# Altium footprint library SoM_Artix.PcbLib: 239 footprints (part 1 of 15)
Each footprint in its own frame and in the unit in brackets; x right, y up, seen from the top. Pads: shape width x height; smd on the part's side, far side on the other; paste and mask are expansions set on the pad; w line width, h text height; cw(c..) or ccw(c..) is an arc to the next point about the centre after c.
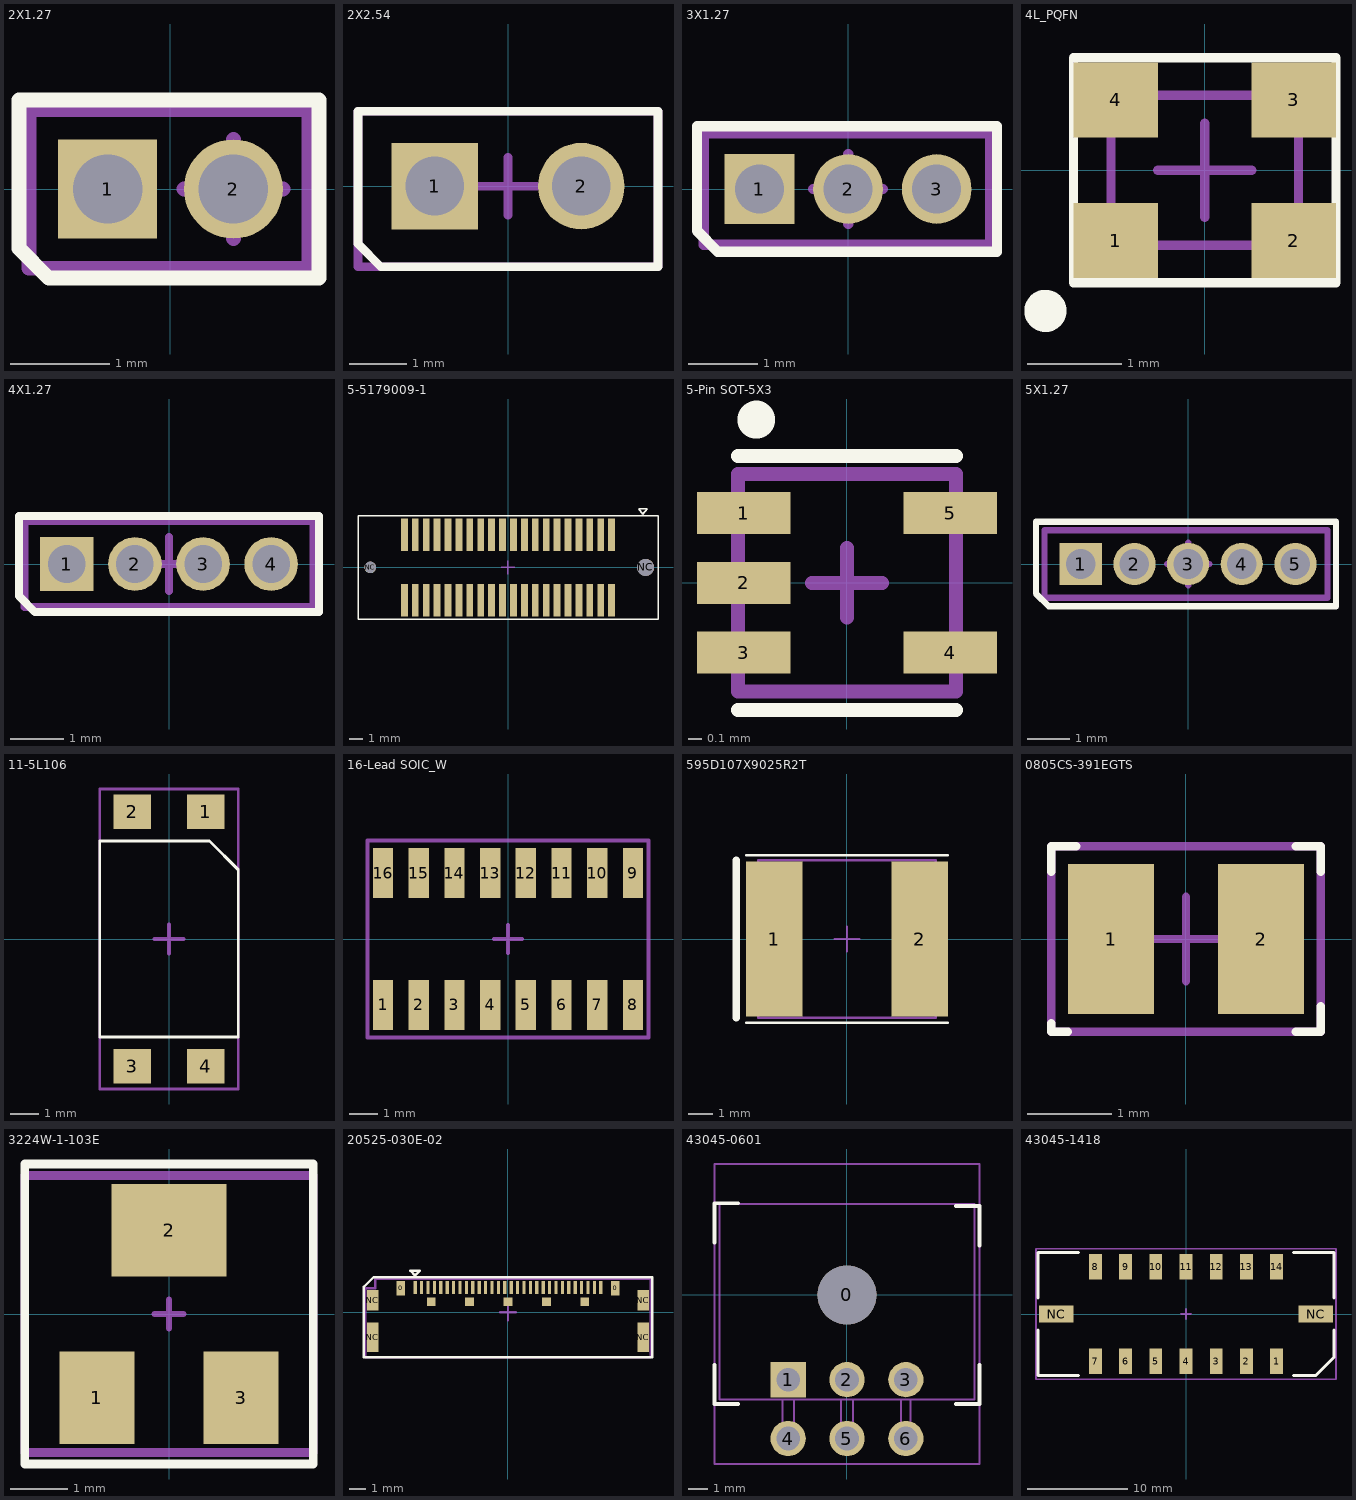
[diagram p0: the footprints below, top view; thin cyan lines are the x and y axes]

## 2X1.27 [mm]
pads (2):
  rect 1x1 hole 0.7: 1(-0.635,0)
  round 1 hole 0.7: 2(0.635,0)
Top Overlay:
  lines w0.15: -1.53,-0.6 -1.23,-0.9 1.5,-0.9 1.5,0.9 -1.53,0.9 -1.53,-0.6
Mechanical 15:
  lines w0.15: 0.135,0 1.135,0 ; 0.635,-0.5 0.635,0.5 ; -1.43,-0.8 1.4,-0.8 1.4,0.8 -1.43,0.8 -1.43,-0.8

## 2X2.54 [mm]
pads (2):
  rect 1.5x1.5 hole 1.02: 1(-1.27,0)
  round 1.5 hole 1.02: 2(1.27,0)
Top Overlay:
  lines w0.15: -2.6,-1 -2.6,1.3 2.6,1.3 2.6,-1.4 -2.2,-1.4 -2.6,-1
Mechanical 15:
  lines w0.15: -0.5,0 0.5,0 ; 0,-0.5 0,0.5 ; -2.6,-1.4 -2.6,1.3 2.6,1.3 2.6,-1.4 -2.6,-1.4
3D body "User Library-PLS-2.step": height 8.54, standoff -3, extent -2.54,-1.3 2.54,1.24

## 3X1.27 [mm]
pads (3):
  rect 1x1 hole 0.7: 1(-1.27,0)
  round 1 hole 0.7: 2(0,0) 3(1.27,0)
Top Overlay:
  lines w0.15: -2.165,-0.6 -2.165,0.9 2.135,0.9 2.135,-0.9 -1.865,-0.9 -2.165,-0.6
Mechanical 15:
  lines w0.15: -0.5,0 0.5,0 ; 0,-0.5 0,0.5 ; -2.065,-0.8 -2.065,0.8 2.035,0.8 2.035,-0.8 -2.065,-0.8

## 4L_PQFN [mm] "2.0X2.5X0.75 mm"
height 0.75
pads (4):
  rect 0.9x0.8 smd: 1(-0.95,-0.75) 2(0.95,-0.75) 3(0.95,0.75) 4(-0.95,0.75)
Top Overlay:
  circle w0.25: c-1.7,-1.5 r0.1
  lines w0.1: -1.4,-1.2 1.4,-1.2 1.4,1.2 -1.4,1.2 -1.4,-1.2
Mechanical 15:
  lines w0.1: -0.5,0 0.5,0 ; 0,-0.5 0,0.5 ; -1,-0.8 -1,0.8 1,0.8 1,-0.8 -1,-0.8 ; 0,0 0,0

## 4X1.27 [mm]
pads (4):
  rect 1x1 hole 0.7: 1(-1.905,0)
  round 1 hole 0.7: 2(-0.635,0) 3(0.635,0) 4(1.905,0)
Top Overlay:
  lines w0.15: -2.8,-0.6 -2.5,-0.9 2.8,-0.9 2.8,0.9 -2.8,0.9 -2.8,-0.6
Mechanical 15:
  lines w0.15: -0.5,0 0.5,0 ; 0,-0.5 0,0.5 ; -2.7,-0.8 2.7,-0.8 2.7,0.8 -2.7,0.8 -2.7,-0.8

## 5-5179009-1 [mm]
height 12
pads (42):
  rect 0.5x2.4 smd mask+0.05: 1(7.6,2.4) 2(7.6,-2.4) 3(6.8,2.4) 4(6.8,-2.4) 5(6,2.4) 6(6,-2.4) 7(5.2,2.4) 8(5.2,-2.4) 9(4.4,2.4) 10(4.4,-2.4) 11(3.6,2.4) 12(3.6,-2.4) 13(2.8,2.4) 14(2.8,-2.4) 15(2,2.4) 16(2,-2.4) 17(1.2,2.4) 18(1.2,-2.4) 19(0.4,2.4) 20(0.4,-2.4) 21(-0.4,2.4) 22(-0.4,-2.4) 23(-1.2,2.4) 24(-1.2,-2.4) 25(-2,2.4) 26(-2,-2.4) 27(-2.8,2.4) 28(-2.8,-2.4) 29(-3.6,2.4) 30(-3.6,-2.4) 31(-4.4,2.4) 32(-4.4,-2.4) 33(-5.2,2.4) 34(-5.2,-2.4) 35(-6,2.4) 36(-6,-2.4) 37(-6.8,2.4) 38(-6.8,-2.4) 39(-7.6,2.4) 40(-7.6,-2.4)
  round 0.85 hole 0.85 unplated mask+0.05: NC(-10.1,0)
  round 1.25 hole 1.25 unplated mask+0.05: NC(10.1,0)
Top Overlay:
  lines w0.1: -11,-3.8 11,-3.8 11,3.8 -11,3.8 -11,-3.8 ; 9.6,4.3 9.9,3.9 10.2,4.3 9.6,4.3
Mechanical 15:
  lines w0.1: -0.5,0 0.5,0 ; 0,-0.502 0,0.498
3D body "User Library-c-5-5179009-1-a-3d.step": height 7.7, standoff -0.55, extent -10.9,-3.4 10.9,3.4

## 5-Pin SOT-5X3 [mm]
pads (5):
  rect 0.67x0.3 smd: 1(-0.74,0.5) 2(-0.74,0) 3(-0.74,-0.5) 4(0.74,-0.5) 5(0.74,0.5)
Top Overlay:
  circle w0.25: c-0.65,1.17 r0.01
  lines w0.1: -0.78,-0.91 0.78,-0.91 ; -0.78,0.91 0.78,0.91
Mechanical 15:
  lines w0.1: -0.25,0 0.25,0 ; 0,-0.25 0,0.25 ; -0.78,-0.78 0.78,-0.78 0.78,0.78 -0.78,0.78 -0.78,-0.78
3D body "SN74LVC1G14DRLRG4.STEP": height 0.59, standoff -0.01, extent -0.8,-0.8 0.8,0.8

## 5X1.27 [mm]
pads (5):
  rect 1x1 hole 0.7: 1(-2.54,0)
  round 1 hole 0.7: 2(-1.27,0) 3(0,0) 4(1.27,0) 5(2.54,0)
Top Overlay:
  lines w0.15: -3.6,-0.7 -3.6,1 3.5,1 3.5,-1 -3.3,-1 -3.6,-0.7
Mechanical 15:
  lines w0.15: -0.5,0 0.5,0 ; 0,-0.5 0,0.5 ; -3.4,-0.8 3.3,-0.8 3.3,0.8 0,0.8 -3.4,0.8 -3.4,-0.8

## 11-5L106 [mm]
pads (4):
  rect 1.3x1.2 smd mask+0.05: 1(1.27,4.41) 2(-1.27,4.41) 3(-1.27,-4.41) 4(1.27,-4.41)
Top Overlay:
  lines w0.1: -2.4,-3.4 -2.4,3.4 1.4,3.4 2.4,2.4 2.4,-3.4 -2.4,-3.4
Mechanical 15:
  lines w0.1: -2.4,-5.2 -2.4,5.2 2.4,5.2 2.4,-5.2 -2.4,-5.2
  lines w0.15: -0.5,0 0.5,0 ; 0,-0.5 0,0.5
3D body "CircuitWorks-OPTOCOUPLER TLP521-2.step": height 3.72, standoff -0.03, extent -2.29,-4.288 2.29,4.288

## 16-Lead SOIC_W [mm]
pads (16):
  rect 0.72x1.78 smd: 1(-4.445,-2.34) 2(-3.175,-2.34) 3(-1.905,-2.34) 4(-0.635,-2.34) 5(0.635,-2.34) 6(1.905,-2.34) 7(3.175,-2.34) 8(4.445,-2.34) 9(4.445,2.34) 10(3.175,2.34) 11(1.905,2.34) 12(0.635,2.34) 13(-0.635,2.34) 14(-1.905,2.34) 15(-3.175,2.34) 16(-4.445,2.34)
Mechanical 15:
  lines w0.15: -0.5,0 0.5,0 ; 0,-0.5 0,0.5 ; -5,-3.5 -5,3.5 5,3.5 5,-3.5 -5,-3.5

## 595D107X9025R2T [mm]
pads (2):
  rect 2.3x6.3 smd: 1(-2.95,0) 2(2.95,0)
Top Overlay:
  lines w0.1: -4.1,-3.4 4.1,-3.4 ; -4.1,3.4 4.1,3.4
  lines w0.3: -4.5,-3.2 -4.5,3.2
Mechanical 13:
  lines w0.1: -0.5,0 0.5,0 ; 0,-0.5 0,0.5 ; -3.6,-3.2 3.6,-3.2 3.6,3.2 -3.6,3.2 -3.6,-3.2
3D body "User Library-595D-R_SW.step": height 3.5, standoff 0, extent -3.9,-3 3.3,3

## 0805CS-391EGTS [mm]
pads (2):
  rect 1.02x1.78 smd mask+0.05: 1(-0.89,0) 2(0.89,0)
Top Overlay:
  lines w0.1: -1.6,-1 -1.6,-1.1 -1.4,-1.1 ; -1.6,0.8 -1.6,1.1 -1.3,1.1 ; 1.3,-1.1 1.6,-1.1 1.6,-0.8 ; 1.3,1.1 1.6,1.1 1.6,0.8
Mechanical 15:
  lines w0.1: -0.5,0 0.5,0 ; 0,-0.5 0,0.5 ; -1.6,-1.1 1.6,-1.1 1.6,1.1 -1.6,1.1 -1.6,-1.1
3D body "Coilcraft-0805CS.step": height 1.51, standoff -0.01, extent -1.145,-0.863 1.145,0.863

## 3224W-1-103E [mm]
height 5.1
pads (3):
  rect 1.3x1.6 smd: 1(-1.25,-1.45) 3(1.25,-1.45)
  rect 2x1.6 smd: 2(0,1.45)
Top Overlay:
  lines w0.15: -2.5,-2.6 -2.5,2.6 2.5,2.6 2.5,-2.6 -2.5,-2.6
Mechanical 13:
  lines w0.1: -0.25,0 0.25,0 ; 0,-0.25 0,0.25
  lines w0.15: -2.5,-2.4 2.5,-2.4 2.5,2.4 -2.5,2.4 -2.5,-2.4
3D body "User Library-3224w-1-501e.step": height 5.29, standoff 0, extent -2.413,-2.038 2.413,1.9

## 20525-030E-02 [mm] "I-PEX"
height 1
pads (41):
  rect 0.55x0.9 smd mask+0.05: 0(-6.7,1.513) 0(6.7,1.513)
  rect 0.2x0.8 smd mask+0.05: 1(-5.8,1.563) 2(-5.4,1.563) 3(-5,1.563) 4(-4.6,1.563) 5(-4.2,1.563) 6(-3.8,1.563) 7(-3.4,1.563) 8(-3,1.563) 9(-2.6,1.563) 10(-2.2,1.563) 11(-1.8,1.563) 12(-1.4,1.563) 13(-1,1.563) 14(-0.6,1.563) 15(-0.2,1.563) 16(0.2,1.563) 17(0.6,1.563) 18(1,1.563) 19(1.4,1.563) 20(1.8,1.563) 21(2.2,1.563) 22(2.6,1.563) 23(3,1.563) 24(3.4,1.563) 25(3.8,1.563) 26(4.2,1.563) 27(4.6,1.563) 28(5,1.563) 29(5.4,1.563) 30(5.8,1.563)
  rect 0.71x1.85 smd mask+0.05: NC(-8.445,-1.562) NC(8.445,-1.562)
  rect 0.71x1.3 smd mask+0.05: NC(-8.445,0.763) NC(8.445,0.763)
  rect 0.55x0.55 smd mask+0.05: NC(-4.8,0.66) NC(-2.4,0.66) NC(0,0.66) NC(2.4,0.66) NC(4.8,0.66)
Top Overlay:
  lines w0.15: -9,-2.8 -9,1.6 -8.4,2.2 9,2.2 9,-2.8 -9,-2.8 ; -6.1,2.6 -5.5,2.6 -5.8,2.3 -6.1,2.6
Mechanical 13:
  lines w0.15: -0.5,0 0.5,0 ; 0,-0.5 0,0.5 ; -8.9,-2.8 -8.9,1.5 -8.3,1.5 -8.3,2.1 8.9,2.1 8.9,-2.8 -8.9,-2.8
3D body "20525-x30E-02C_RECE_ASS'Y_STEP_R7_ALL.STEP": height 1, standoff 0, extent -8.6,-2.588 8.6,1.562

## 43045-0601 [mm]
pads (7):
  round 3 hole 3 unplated: 0(0,0)
  rect 1.8x1.8 hole 1.2: 1(-3,-4.32)
  round 1.8 hole 1.2: 2(0,-4.32) 3(3,-4.32) 4(-3,-7.32) 5(0,-7.32) 6(3,-7.32)
Top Overlay:
  lines w0.2: -6.75,-3.57 -6.75,-5.57 -5.55,-5.57 ; -6.75,2.68 -6.75,4.68 -5.55,4.68 ; 5.55,-5.57 6.75,-5.57 6.75,-3.57 ; 5.55,4.53 6.75,4.53 6.75,2.53
Mechanical 13:
  lines w0.1: -3.3,-5.32 -3.3,-7.62 -2.7,-7.62 -2.7,-5.32 ; -0.3,-5.32 -0.3,-7.62 0.3,-7.62 0.3,-5.32 ; 2.75,-5.32 2.75,-7.62 3.25,-7.62 3.25,-5.32 ; -6.5,-5.32 -6.5,4.63 6.5,4.63 6.5,-5.32 -6.5,-5.32
  text ".Designator" at 3,3.18 h2
  text "1" at -4.5,-3.82 h2
  text "3" at 5,-3.82 h2
Mechanical 15:
  lines w0.1: -6.75,-8.62 6.75,-8.62 6.75,6.68 -6.75,6.68 -6.75,-8.62
3D body "430450601.stp": height 8.83, standoff -3.12, extent -6.575,-7.635 6.575,4.605

## 43045-1418 [mm]
pads (16):
  rect 1.27x2.54 smd: 1(9,-4.7) 2(6,-4.7) 3(3,-4.7) 4(0,-4.7) 5(-3,-4.7) 6(-6,-4.7) 7(-9,-4.7) 8(-9,4.7) 9(-6,4.7) 10(-3,4.7) 11(0,4.7) 12(3,4.7) 13(6,4.7) 14(9,4.7)
  rect 3.43x1.65 smd: NC(-12.89,0) NC(12.89,0)
Top Overlay:
  lines w0.3: -14.7,-1.6 -14.7,-6.1 -10.7,-6.1 ; -14.7,1.6 -14.7,6.1 -10.7,6.1 ; 10.7,-6.1 12.9,-6.1 14.7,-4.3 14.7,-1.6 ; 10.7,6.1 14.7,6.1 14.7,1.6
Mechanical 15:
  lines w0.15: -0.5,0 0.5,0 ; 0,-0.5 0,0.5 ; -14.9,-6.5 14.9,-6.5 14.9,6.5 -14.9,6.5 -14.9,-6.5
3D body "430451418.stp": height 9.95, standoff 0, extent -14.325,-5.608 14.325,5.588